# Altium footprint library USBes.PcbLib: 65 footprints (part 3 of 5)
Each footprint in its own frame and in the unit in brackets; x right, y up, seen from the top. Pads: shape width x height; smd on the part's side, far side on the other; paste and mask are expansions set on the pad; w line width, h text height; cw(c..) or ccw(c..) is an arc to the next point about the centre after c.
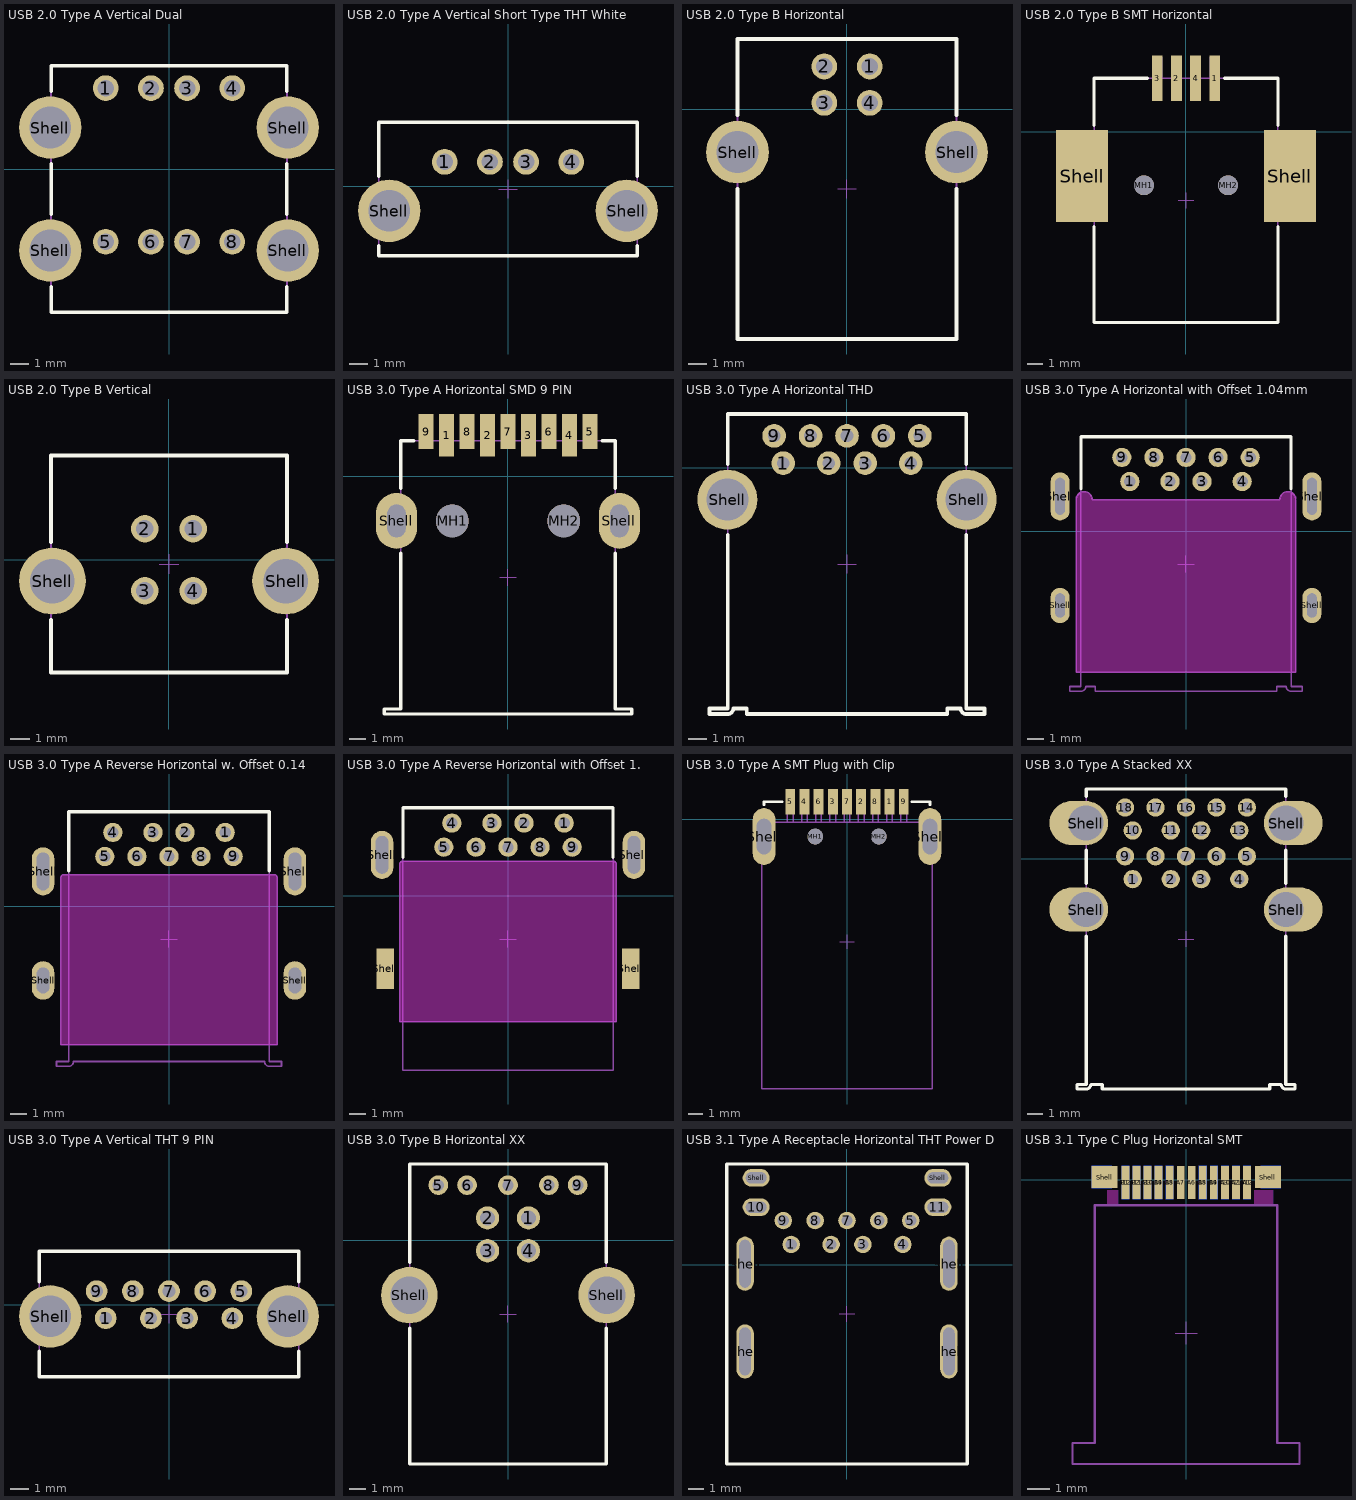
[diagram p2: the footprints below, top view; thin cyan lines are the x and y axes]

## USB 2.0 Type A Vertical Dual [mm] "USB 2.0 Type A Vertical Dual"
height 16.7
pads (12):
  round 1.42 hole 0.92: 1(-3.5,4.49) 2(-1,4.49) 3(1,4.49) 4(3.5,4.49) 5(-3.5,-4.01) 6(-1,-4.01) 7(1,-4.01) 8(3.5,-4.01)
  round 3.45 hole 2.3: Shell(-6.57,-4.49) Shell(-6.57,2.31) Shell(6.57,-4.49) Shell(6.57,2.31)
Top Overlay:
  lines w0.2: -6.52,-6.51 -6.52,-7.91 6.52,-7.91 6.52,-6.51 ; -6.52,-2.47 -6.52,0.29 ; -6.52,4.33 -6.52,5.73 6.52,5.73 6.52,4.33 ; 6.52,-2.47 6.52,0.29
Mechanical 13:
  lines w0.1: -6.52,-7.91 6.52,-7.91 6.52,5.73 -6.52,5.73 -6.52,-7.91
3D body "614008235023.stp": height 17.58, standoff -3.47, extent -7.89,-8.91 7.889,6.73

## USB 2.0 Type A Vertical Short Type THT White [mm] "USB 2.0 Type A Vertical Short Type THT White"
height 10
pads (6):
  round 1.42 hole 0.92: 1(-3.5,1.355) 2(-1,1.355) 3(1,1.355) 4(3.5,1.355)
  round 3.45 hole 2.3: Shell(-6.57,-1.355) Shell(6.57,-1.355)
Top Overlay:
  lines w0.2: -7.15,-3.295 -7.15,-3.845 7.15,-3.845 7.15,-3.295 ; -7.15,0.555 -7.15,3.555 7.15,3.555 7.15,0.555
Mechanical 13:
  lines w0.1: -7.15,-3.845 7.15,-3.845 7.15,3.555 -7.15,3.555 -7.15,-3.845
Mechanical 15:
  lines w0.05: -0.5,-0.145 0.5,-0.145 ; 0,-0.645 0,0.355
3D body "614004185023.stp": height 10.03, standoff -2.97, extent -7.15,-3.845 7.15,3.555

## USB 2.0 Type B Horizontal [mm] "USB 2.0 Type B Horizontal"
height 11.05
pads (6):
  round 1.42 hole 0.92: 1(1.25,2.355) 2(-1.25,2.355) 3(-1.25,0.355) 4(1.25,0.355)
  round 3.45 hole 2.3: Shell(-6.02,-2.355) Shell(6.02,-2.355)
Top Overlay:
  lines w0.2: -6.02,-4.385 -6.02,-12.635 6.02,-12.635 6.02,-4.385 ; -6.02,-0.325 -6.02,3.865 6.02,3.865 6.02,-0.325
Mechanical 13:
  lines w0.1: -6.02,-12.635 6.02,-12.635 6.02,3.865 -6.02,3.865 -6.02,-12.635
Mechanical 15:
  lines w0.05: -0.5,-4.385 0.5,-4.385 ; 0,-4.885 0,-3.885
3D body "61400416121.stp": height 11.08, standoff -3.78, extent -7.484,-12.635 7.484,3.865

## USB 2.0 Type B SMT Horizontal [mm] "USB 2.0 Type B SMT Horizontal"
height 11.5
pads (8):
  rect 0.7x3 smd: 1(1.875,3.5) 2(-0.625,3.5) 3(-1.875,3.5) 4(0.625,3.5)
  round 1.3 hole 1.3 unplated: MH1(-2.75,-3.5) MH2(2.75,-3.5)
  rect 3.4x6.04 smd: Shell(-6.8,-2.9) Shell(6.8,-2.9)
Top Overlay:
  lines w0.2: -6.02,-6.2 -6.02,-12.5 6.02,-12.5 6.02,-6.2 ; -6.02,0.4 -6.02,3.5 -2.52,3.5 ; 2.52,3.5 6.02,3.5 6.02,0.4
Mechanical 13:
  lines w0.1: -6.02,-5.25 -8.1,-5.25 -8.1,-0.55 -6.02,-0.55 ; -2.175,3.5 -2.175,4.89 -1.575,4.89 -1.575,3.5 ; -0.925,3.5 -0.925,4.89 -0.325,4.89 -0.325,3.5 ; 0.325,3.5 0.325,4.89 0.925,4.89 0.925,3.5 ; 1.575,3.5 1.575,4.89 2.175,4.89 2.175,3.5 ; 6,3.5 -6.02,3.5 -6.02,-12.5 6.02,-12.5 6.02,3.5 ; 6.02,-5.25 8.1,-5.25 8.1,-0.55 6.02,-0.55
Mechanical 15:
  lines w0.05: -0.5,-4.5 0.5,-4.5 ; 0,-5 0,-4
3D body "62910416121.stp": height 11.16, standoff -0.81, extent -8.1,-12.5 8.1,4.888

## USB 2.0 Type B Vertical [mm] "USB 2.0 Type B Vertical"
height 16.1
pads (6):
  round 1.42 hole 0.92: 1(1.25,1.6) 2(-1.25,1.6) 3(-1.25,-1.6) 4(1.25,-1.6)
  round 3.45 hole 2.3: Shell(-6.02,-1.1) Shell(6.02,-1.1)
Top Overlay:
  lines w0.2: -6.1,-3.12 -6.1,-5.82 6.1,-5.82 6.1,-3.12 ; -6.1,0.92 -6.1,5.38 6.1,5.38 6.1,0.92
Mechanical 13:
  lines w0.1: -6.1,-5.82 -6.1,5.38 6.1,5.38 6.1,-5.82 -6.1,-5.82
Mechanical 15:
  lines w0.05: -0.5,-0.22 0.5,-0.22 ; 0,-0.72 0,0.28
3D body "61400413321.stp": height 16.14, standoff -4.18, extent -7.35,-5.82 7.35,5.38

## USB 3.0 Type A Horizontal SMD 9 PIN [mm] "USB 3.0 Type A Horizontal SMD 9 PIN"
height 6.99
pads (13):
  rect 0.9x2.6 smd: 1(-3.75,2.498) 2(-1.25,2.498) 3(1.25,2.498) 4(3.75,2.498)
  rect 0.9x2.15 smd: 5(5,2.723) 6(2.5,2.723) 7(0,2.723) 8(-2.5,2.723) 9(-5,2.723)
  round 2 hole 2 unplated: MH1(-3.4,-2.722) MH2(3.4,-2.722)
  oval 2.52x3.4 hole 1.12 slot 2 at 90 deg: Shell(-6.8,-2.722) Shell(6.8,-2.722)
Top Overlay:
  lines w0.2: -6.55,-4.702 -6.55,-14.202 -7.55,-14.202 -7.55,-14.502 7.55,-14.502 7.55,-14.202 6.55,-14.202 6.55,-4.702 ; -6.55,-0.743 -6.55,2.158 -5.75,2.158 ; 5.75,2.158 6.55,2.158 6.55,-0.743
Mechanical 13:
  lines w0.1: -5.25,2.158 -5.25,3.298 -4.75,3.298 -4.75,2.158 ; -4,2.158 -4,3.298 -3.5,3.298 -3.5,2.158 ; -2.75,2.158 -2.75,3.298 -2.25,3.298 -2.25,2.158 ; -1.5,2.158 -1.5,3.298 -1,3.298 -1,2.158 ; -0.25,2.158 -0.25,3.298 0.25,3.298 0.25,2.158 ; 1,2.158 1,3.298 1.5,3.298 1.5,2.158 ; 2.25,2.158 2.25,3.298 2.75,3.298 2.75,2.158 ; 3.5,2.158 3.5,3.298 4,3.298 4,2.158 ; 4.75,2.158 4.75,3.298 5.25,3.298 5.25,2.158 ; -7.55,-14.502 -7.55,-14.202 -6.55,-14.202 -6.55,2.158 6.55,2.158 6.55,-14.202 7.55,-14.202 7.55,-14.502 -7.55,-14.502
Mechanical 15:
  lines w0.05: -0.5,-6.172 0.5,-6.172 ; 0,-6.672 0,-5.672
3D body "692122030100.stp": height 7.95, standoff -2.29, extent -7.55,-14.502 7.55,3.298

## USB 3.0 Type A Horizontal THD [mm] "USB 3.0 Type A Horizontal THD"
height 6.99
pads (11):
  round 1.3 hole 0.7: 1(-3.5,0.25) 2(-1,0.25) 3(1,0.25) 4(3.5,0.25) 5(4,1.75) 6(2,1.75) 7(0,1.75) 8(-2,1.75) 9(-4,1.75)
  round 3.3 hole 2.3: Shell(-6.57,-1.75) Shell(6.57,-1.75)
Top Overlay:
  lines w0.2: -6.55,-3.68 -6.55,-13.23 -7.55,-13.23 -7.55,-13.53 -6.56,-13.53 ccw(c-6.55,-13.23) -6.25,-13.23 -5.5,-13.23 -5.5,-13.53 5.5,-13.53 5.5,-13.23 6.25,-13.23 ccw(c6.55,-13.23) 6.56,-13.53 7.55,-13.53 7.55,-13.23 6.55,-13.23 6.55,-3.68 ; -6.55,0.18 -6.55,2.95 6.55,2.95 6.55,0.18
Mechanical 13:
  lines w0.1: -7.55,-13.53 -7.55,-13.23 -6.55,-13.23 -6.55,2.95 6.55,2.95 6.55,-13.23 7.55,-13.23 7.55,-13.53 6.56,-13.53 cw(c6.55,-13.23) 6.25,-13.23 5.5,-13.23 5.5,-13.53 -5.5,-13.53 -5.5,-13.23 -6.25,-13.23 cw(c-6.55,-13.23) -6.56,-13.53 -7.55,-13.53
Mechanical 15:
  lines w0.05: -0.5,-5.29 0.5,-5.29 ; 0,-5.79 0,-4.79
3D body "692121030100.stp": height 8.03, standoff -3.19, extent -7.74,-13.53 7.74,3.02

## USB 3.0 Type A Horizontal with Offset 1.04mm [mm] "USB 3.0 Type A Horizontal with Offset 1.04mm"
height 3.9
pads (13):
  round 1.2 hole 0.7: 1(-3.5,3.115) 2(-1,3.115) 3(1,3.115) 4(3.5,3.115) 5(4,4.615) 6(2,4.615) 7(0,4.615) 8(-2,4.615) 9(-4,4.615)
  oval 1.2x2.2 hole 0.6 slot 1.5 at 90 deg: Shell(-7.85,-4.615) Shell(7.85,-4.615)
  oval 1.2x3 hole 0.6 slot 2.3 at 90 deg: Shell(-7.85,2.185) Shell(7.85,2.185)
Top Overlay:
  lines w0.2: -6.55,2.655 -6.55,5.905 6.55,5.905 6.55,2.655
Keep-Out Layer:
  board cut-out: -6.85,-8.785 6.85,-8.785 6.85,1.985 6.85,2.085 6.774,2.268 6.633,2.409 6.449,2.485 6.251,2.485 6.067,2.409 5.926,2.268 5.85,2.085 5.85,1.985 -5.85,1.985 -5.85,2.085 -5.926,2.268 -6.067,2.409 -6.251,2.485 -6.449,2.485 -6.633,2.409 -6.774,2.268 -6.85,2.085 -6.85,1.985
Mechanical 2:
  lines w0.1: -6.85,-8.785 -6.85,1.985 cw(c-6.35,1.985) -5.85,1.985 5.85,1.985 cw(c6.35,1.985) 6.85,1.985 6.85,-8.785 -6.85,-8.785
Mechanical 13:
  lines w0.1: -7.25,-9.965 -7.25,-9.665 -6.55,-9.665 -6.55,5.905 6.55,5.905 6.55,-9.665 7.25,-9.665 7.25,-9.965 6.56,-9.965 cw(c6.55,-9.665) 6.25,-9.665 5.65,-9.665 5.65,-9.965 -5.65,-9.965 -5.65,-9.665 -6.25,-9.665 cw(c-6.55,-9.665) -6.56,-9.965 -7.25,-9.965
Mechanical 15:
  lines w0.05: -0.5,-2.03 0.5,-2.03 ; 0,-2.53 0,-1.53
3D body "692121230100.stp": height 4.63, standoff -2.49, extent -8,-9.965 8,5.905

## USB 3.0 Type A Reverse Horizontal w. Offset 0.14mm [mm] "USB 3.0 Type A Reverse Horizontal w. Offset 0.14mm"
height 5.12
pads (13):
  round 1.2 hole 0.7: 1(3.5,4.615) 2(1,4.615) 3(-1,4.615) 4(-3.5,4.615) 5(-4,3.115) 6(-2,3.115) 7(0,3.115) 8(2,3.115) 9(4,3.115)
  oval 1.4x2.4 hole 0.8 slot 1.6 at 90 deg: Shell(-7.85,-4.615) Shell(7.85,-4.615)
  oval 1.4x3 hole 0.8 slot 2.35 at 90 deg: Shell(-7.85,2.185) Shell(7.85,2.185)
Top Overlay:
  lines w0.2: -6.25,2.22 -6.25,5.905 6.25,5.905 6.25,2.22
Keep-Out Layer:
  board cut-out: -6.75,-8.615 6.75,-8.615 6.75,1.785 6.75,1.825 6.72,1.898 6.663,1.955 6.59,1.985 6.55,1.985 -6.55,1.985 -6.59,1.985 -6.663,1.955 -6.72,1.898 -6.75,1.825 -6.75,1.785
Mechanical 2:
  lines w0.1: -6.75,-8.615 -6.75,1.785 cw(c-6.55,1.785) -6.55,1.985 6.55,1.985 cw(c6.55,1.785) 6.75,1.785 6.75,-8.615 -6.75,-8.615
Mechanical 13:
  lines w0.1: -7.01,-9.965 -7.01,-9.665 -6.25,-9.665 -6.25,5.905 6.25,5.905 6.25,-9.665 7.01,-9.665 7.01,-9.965 6.26,-9.965 cw(c6.25,-9.665) 5.95,-9.665 -5.95,-9.665 cw(c-6.25,-9.665) -6.26,-9.965 -7.01,-9.965
Mechanical 15:
  lines w0.05: -0.5,-2.03 0.5,-2.03 ; 0,-2.53 0,-1.53
3D body "692121130100.stp": height 4.03, standoff -3.69, extent -8.078,-9.965 8.078,5.905

## USB 3.0 Type A Reverse Horizontal with Offset 1.75mm [mm] "USB 3.0 Type A Reverse Horizontal with Offset 1.75mm"
height 7.4
pads (13):
  round 1.2 hole 0.7: 1(3.5,4.54) 2(1,4.54) 3(-1,4.54) 4(-3.5,4.54) 5(-4,3.04) 6(-2,3.04) 7(0,3.04) 8(2,3.04) 9(4,3.04)
  oval 1.4x3 hole 0.8 slot 2.35 at 90 deg: Shell(-7.85,2.56) Shell(7.85,2.56)
  rect 1.1x2.5 smd: Shell(-7.65,-4.54) Shell(7.65,-4.54)
Top Overlay:
  lines w0.2: -6.55,2.415 -6.55,5.5 6.55,5.5 6.55,2.415
Keep-Out Layer:
  board cut-out: -6.75,-7.84 -6.75,1.99 -6.75,2.024 -6.724,2.086 -6.676,2.134 -6.614,2.16 -6.58,2.16 6.58,2.16 6.614,2.16 6.676,2.134 6.724,2.086 6.75,2.024 6.75,1.99 6.75,-7.84
Mechanical 2:
  lines w0.1: -6.75,-7.84 6.75,-7.84 6.75,1.99 ccw(c6.58,1.99) 6.58,2.16 -6.58,2.16 ccw(c-6.58,1.99) -6.75,1.99 -6.75,-7.84
Mechanical 13:
  lines w0.1: -6.55,-10.87 6.55,-10.87 6.55,5.5 -6.55,5.5 -6.55,-10.87
Mechanical 15:
  lines w0.05: -0.5,-2.685 0.5,-2.685 ; 0,-3.185 0,-2.185
3D body "692121330100.stp": height 2.98, standoff -4.42, extent -8,-10.87 8,5.5

## USB 3.0 Type A SMT Plug with Clip [mm] "USB 3.0 Type A SMT Plug with Clip"
height 4.5
pads (13):
  rect 0.7x1.8 smd: 1(3,1.225) 2(1,1.225) 3(-1,1.225) 4(-3,1.225) 5(-4,1.225) 6(-2,1.225) 7(0,1.225) 8(2,1.225) 9(4,1.225)
  round 1.1 hole 1.1 unplated: MH1(-2.25,-1.225) MH2(2.25,-1.225)
  oval 1.6x4 hole 1 slot 2.5 at 90 deg: Shell(-5.85,-1.225) Shell(5.85,-1.225)
Top Overlay:
  lines w0.2: -5.85,1.016 -5.85,1.225 -4.572,1.225 ; 4.572,1.225 5.85,1.225 5.85,1.016
Mechanical 13:
  lines w0.1: -4.2,-0.225 -4.2,1.725 -3.8,1.725 -3.8,-0.225 ; -3.2,-0.225 -3.2,1.725 -2.8,1.725 -2.8,-0.225 ; -2.2,-0.225 -2.2,1.725 -1.8,1.725 -1.8,-0.225 ; -1.2,-0.225 -1.2,1.725 -0.8,1.725 -0.8,-0.225 ; -0.2,-0.225 -0.2,1.725 0.2,1.725 0.2,-0.225 ; 0.8,-0.225 0.8,1.725 1.2,1.725 1.2,-0.225 ; 1.8,-0.225 1.8,1.725 2.2,1.725 2.2,-0.225 ; 2.8,-0.225 2.8,1.725 3.2,1.725 3.2,-0.225 ; 3.8,-0.225 3.8,1.725 4.2,1.725 4.2,-0.225 ; -6,-19.025 -6,-0.225 6,-0.225 6,-19.025 -6,-19.025
Mechanical 15:
  lines w0.05: -0.5,-8.65 0.5,-8.65 ; 0,-9.15 0,-8.15
3D body "692112030100.stp": height 1.84, standoff -2.66, extent -6,-19.025 6,1.725

## USB 3.0 Type A Stacked XX [mm] "USB 3.0 Type A Stacked XX"
height 15.42
pads (22):
  round 1.2 hole 0.7: 1(-3.5,-1.35) 2(-1,-1.35) 3(1,-1.35) 4(3.5,-1.35) 5(4,0.15) 6(2,0.15) 7(0,0.15) 8(-2,0.15) 9(-4,0.15) 10(-3.5,1.85) 11(-1,1.85) 12(1,1.85) 13(3.5,1.85) 14(4,3.35) 15(2,3.35) 16(0,3.35) 17(-2,3.35) 18(-4,3.35)
  oval 3.85x2.9 hole 2.3 copper offset -0.475,0: Shell(-6.57,-3.35) Shell(-6.57,2.33)
  oval 3.85x2.9 hole 2.3 copper offset 0.475,0: Shell(6.57,-3.35) Shell(6.57,2.33)
Top Overlay:
  lines w0.2: -6.55,-5.08 -6.55,-14.83 -7.15,-14.83 -7.15,-15.13 -6.56,-15.13 ccw(c-6.55,-14.83) -6.25,-14.83 -5.5,-14.83 -5.5,-15.13 5.5,-15.13 5.5,-14.83 6.25,-14.83 ccw(c6.55,-14.83) 6.56,-15.13 7.15,-15.13 7.15,-14.83 6.55,-14.83 6.55,-5.08 ; -6.55,-1.62 -6.55,0.57 ; -6.55,4.07 -6.55,4.57 6.55,4.57 6.55,4.07 ; 6.55,-1.62 6.55,0.57
Mechanical 13:
  lines w0.1: -7.15,-15.13 -6.56,-15.13 ccw(c-6.55,-14.83) -6.25,-14.83 -5.5,-14.83 -5.5,-15.13 5.5,-15.13 5.5,-14.83 6.25,-14.83 ccw(c6.55,-14.83) 6.56,-15.13 7.15,-15.13 7.15,-14.83 6.55,-14.83 6.55,4.57 -6.55,4.57 -6.55,-14.83 -7.15,-14.83 -7.15,-15.13
Mechanical 15:
  lines w0.05: -0.5,-5.28 0.5,-5.28 ; 0,-5.78 0,-4.78
3D body "692141030100.stp": height 16.13, standoff -3.48, extent -7.794,-15.93 7.792,4.57

## USB 3.0 Type A Vertical THT 9 PIN [mm] "USB 3.0 Type A Vertical THT 9 PIN"
height 15
pads (11):
  round 1.2 hole 0.7: 1(-3.5,-0.75) 2(-1,-0.75) 3(1,-0.75) 4(3.5,-0.75) 5(4,0.75) 6(2,0.75) 7(0,0.75) 8(-2,0.75) 9(-4,0.75)
  round 3.45 hole 2.3: Shell(-6.57,-0.65) Shell(6.57,-0.65)
Top Overlay:
  lines w0.2: -7.175,-2.59 -7.175,-3.99 7.175,-3.99 7.175,-2.59 ; -7.175,1.26 -7.175,2.96 7.175,2.96 7.175,1.26
Mechanical 13:
  lines w0.1: -7.175,-3.99 -7.175,2.96 7.175,2.96 7.175,-3.99 -7.175,-3.99
Mechanical 15:
  lines w0.05: -0.5,-0.515 0.5,-0.515 ; 0,-1.015 0,-0.015
3D body "692121430000.stp": height 15.03, standoff -3.74, extent -7.8,-3.99 7.8,2.96

## USB 3.0 Type B Horizontal XX [mm] "USB 3.0 Type B Horizontal XX"
height 12.9
pads (11):
  round 1.42 hole 0.92: 1(1.25,1.355) 2(-1.25,1.355) 3(-1.25,-0.645) 4(1.25,-0.645)
  round 1.2 hole 0.7: 5(-4.25,3.355) 6(-2.5,3.355) 7(0,3.355) 8(2.5,3.355) 9(4.25,3.355)
  round 3.45 hole 2.3: Shell(-6.02,-3.355) Shell(6.02,-3.355)
Top Overlay:
  lines w0.2: -6,-5.355 -6,-13.655 6,-13.655 6,-5.355 ; -6,-1.355 -6,4.645 6,4.645 6,-1.355
Mechanical 13:
  lines w0.1: -6,-13.655 6,-13.655 6,4.645 -6,4.645 -6,-13.655
Mechanical 15:
  lines w0.05: -0.5,-4.505 0.5,-4.505 ; 0,-5.005 0,-4.005
3D body "692221030100.stp": height 12.93, standoff -3.2, extent -7.2,-13.655 7.2,4.645

## USB 3.1 Type A Receptacle Horizontal THT Power Delivery [mm] "USB 3.1 Type A Receptacle Horizontal THT Power Delivery"
height 8.01
pads (17):
  round 1.1 hole 0.7: 1(-3.5,1.265) 2(-1,1.265) 3(1,1.265) 4(3.5,1.265) 5(4,2.765) 6(2,2.765) 7(0,2.765) 8(-2,2.765) 9(-4,2.765)
  oval 1.7x1.1 hole 0.7 slot 1.3 at 0 deg: 10(-5.7,3.605) 11(5.7,3.605) Shell(-5.7,5.445) Shell(5.7,5.445)
  oval 1.1x3.4 hole 0.7 slot 3 at 90 deg: Shell(-6.4,-5.445) Shell(-6.4,0.055) Shell(6.4,-5.445) Shell(6.4,0.055)
Top Overlay:
  lines w0.2: -7.55,-12.515 7.55,-12.515 7.55,6.315 -7.55,6.315 -7.55,-12.515
Mechanical 13:
  lines w0.1: -7.55,-12.515 -7.55,6.315 7.55,6.315 7.55,-12.515 -7.55,-12.515
Mechanical 15:
  lines w0.05: -0.5,-3.1 0.5,-3.1 ; 0,-3.6 0,-2.6
3D body "632121300001.stp": height 8.01, standoff -1.81, extent -7.55,-12.515 7.55,6.315

## USB 3.1 Type C Plug Horizontal SMT [mm] "USB 3.1 Type C Plug Horizontal SMT"
height 2.4
pads (26):
  rect 0.35x1.5 smd: A1(2.75,-0.125) A2(2.25,-0.125) A3(1.75,-0.125) A4(1.25,-0.125) A5(0.75,-0.125) A6(0.25,-0.125) A7(-0.25,-0.125) A8(-0.75,-0.125) A9(-1.25,-0.125) A10(-1.75,-0.125) A11(-2.25,-0.125) A12(-2.75,-0.125)
  rect 0.35x1.5 smd far side: B1(-2.75,-0.125) B2(-2.25,-0.125) B3(-1.75,-0.125) B4(-1.25,-0.125) B5(-0.75,-0.125) B8(0.75,-0.125) B9(1.25,-0.125) B10(1.75,-0.125) B11(2.25,-0.125) B12(2.75,-0.125)
  rect 0.9x1 smd far side: Shell(-3.825,0.125) Shell(3.825,0.125)
  rect 1.18x1 smd: Shell(-3.69,0.125) Shell(3.69,0.125)
Keep-Out Layer:
  board cut-out: 3.075,-1.075 3.075,-0.475 3.945,-0.475 3.945,-1.075
  board cut-out: -3.58,-1.075 -3.58,-0.475 -3.08,-0.475 -3.08,-1.075
Mechanical 13:
  lines w0.1: -5.135,-12.845 5.115,-12.845 5.115,-11.895 4.115,-11.895 4.115,-1.145 -4.135,-1.145 -4.135,-11.895 -5.135,-11.895 -5.135,-12.845
Mechanical 15:
  lines w0.05: -0.5,-6.925 0.5,-6.925 ; 0,-7.425 0,-6.425
3D body "632712000011.stp": height 1.74, standoff -2.46, extent -5.135,-12.845 5.115,0.555